# Altium schematic symbol library SCHLIB.SchLib: 2608 symbols (part 3 of 20) (continued)
## CON-PCI Express x8 (continued)

## CON-POWER
designator J?, comment POWER
CONN QC TAB 0.187 SOLDER; Manufacturer: Molex; Manufacturer Part Number: 0197084013; Body Plating: Tin; Body Material: Brass; Gender: Male; Insulation: Non-Insulated; Tab Width: 0.187inch; Tab Thickness: 0.032inch; Tab Length: 0.255inch; Washability: OK; Supplier 1: Digi-Key; Stock 1: 25761; Pricing 1: 1=0.13, 10=0.122, 25=0.0908, 50=0.0778, 100=0.0753, 250=0.06492, 500=0.0623, 1000=0.05452, 2500=0.04932 (USD); Mount: Through Hole; Contact Material: Brass; Contact Plating: Tin; Packaging: Tape and Reel; Package Quantity: 10000; Termination: Standard; Length: 0.51inch; Depth: 6.3mm; ComponentLink1URL: http://www.molex.com/webdocs/datasheets/pdf/en-us/0197084013_QUICK_DISCONNECTS.pdf?src-supplier=Avnet; ComponentLink1Description: http://www.molex.com/webdocs/datasheets/pdf/en-us/0197084013_QUICK_DISCONNECTS.pdf?src-supplier=Avnet; ComponentLink2URL: http://www.molex.com/pdm_docs/sd/197084001_sd.pdf?src-supplier=Digi-Key; ComponentLink2Description: http://www.molex.com/pdm_docs/sd/197084001_sd.pdf?src-supplier=Digi-Key; ComponentLink3URL: http://components.arrow.com/part/dataview/4716213S8383569N3303?src-supplier=Arrow; ComponentLink3Description: http://components.arrow.com/part/dataview/4716213S8383569N3303?src-supplier=Arrow; Supplier Part Number 1: WM14275CT-ND; Supplier 2: Digi-Key; Supplier Part Number 2: 952-3573-ND
footprint CON-POWER
pins: 1 GND_IN, 2, 3

## CON-PREC008DAAN-RC
designator J?, comment 2.54MM
Conn Header Vert 16POS 2.54MM; Manufacturer: Sullins; Manufacturer Part Number: PREC008DAAN-RC; Number of Positions: 16; Connector Type: Male Pin; Pitch: 0.1inch; Supplier 1: Digi-Key; Supplier Part Number 1: S2012EC-08-ND; RoHS: Yes; Category: Connectors; Stock 1: 1761; Pricing 1: 1=0.35000, 10=0.33300, 25=0.28600, 50=0.24300, 100=0.23340, 250=0.20960, 500=0.20008 (USD); Mount: Through Hole; Color: Black; Contact Plating: Tin; Package Quantity: 1; Number of Rows: 2; Packaging: Bulk; Termination: Solder; Series: -; Contact Type: Male Pin; Row Spacing: 0.1inch; Contact Mating Length: 0.23inch; RoHS Compliant: Yes; ComponentLink1URL: https://datasheet.ciiva.com/740/xrxczzzdxxn-rc-11636-b-740877.pdf?src-supplier=Digi-Key; ComponentLink1Description: https://datasheet.ciiva.com/740/xrxczzzdxxn-rc-11636-b-740877.pdf?src-supplier=Digi-Key
pins: 1, 2, 3, 4, 5, 6, 7, 8, 9, 10, 11, 12, 13, 14, 15, 16

## CON-PT02Y10-6P-SCC-023
designator J?, comment PT02Y10-6P-SCC
PT 6C 6#20 PIN RECP; Manufacturer 1: Amphenol Socapex; Manufacturer Part Number 1: PT02Y10-6P-SCC-023; Body Material: Aluminium; Gender: Receptacle; Number of Contacts: 6; Connector Type: Circular; Washability: OK; Supplier 1: Farnell; Stock 1: 0; Pricing 1: 1=33,95000, 5=30,00000, 10=25,80000, 25=22,24000 (EUR); RoHS: Yes; Contact Material: Copper Alloy; Contact Plating: Gold; Termination: Solder; REACH SVHC: Yes; Supplier Part Number 1: 2270273
footprint CON-PT02Y10-6P
pins: A, B, C, D, E, F

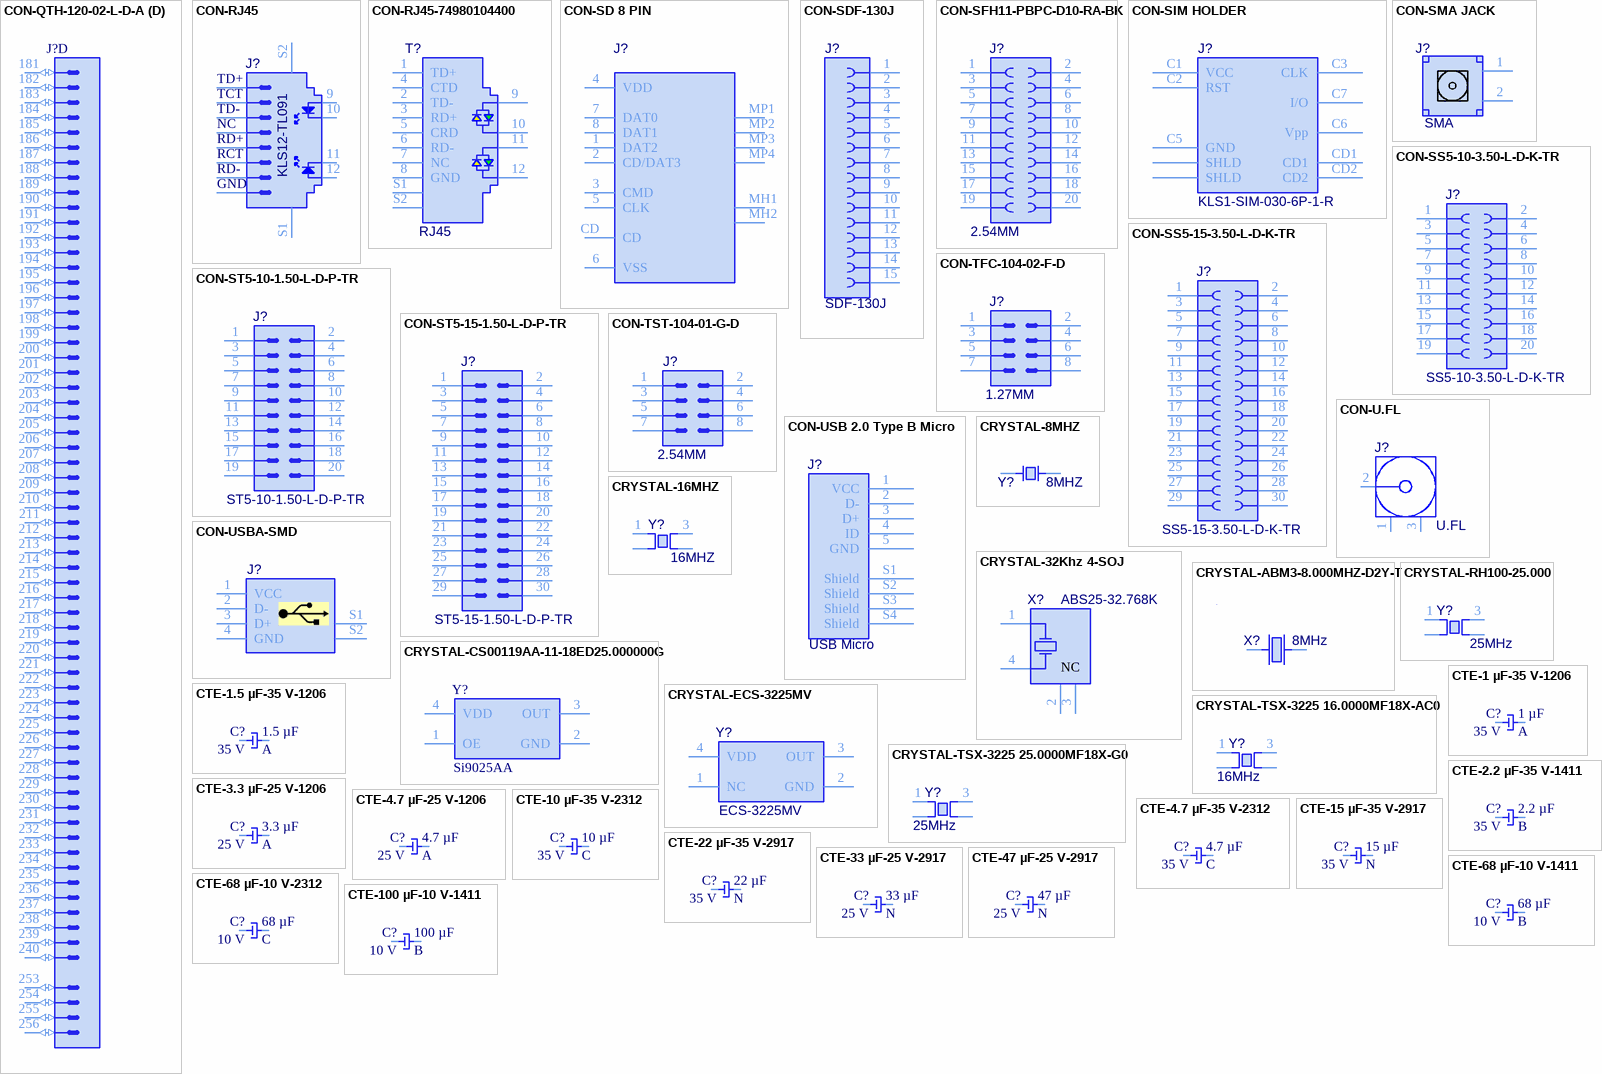
[diagram p10: symbols CON-QTH-120-02-L-D-A to CTE-100 µF-10 V-1411]

## CON-QTH-120-02-L-D-A
designator J?
CONN HDR 240POS SMD GOLD; Part Description: 240 Contacts ((2X30)x4), Pitch 0.5mm, Straight Double Row High Speed Ground Plane Header (Lead Style 7.26mm); Manufacturer: SAMTEC; Manufacturer Part Number: QTH-120-02-L-D-A; PressFit: No; Component Kind: Standard; Component Type: Standard; Footprint: SAMTEC_QTH-120-02-L-D-A; Pin Count: 256; Mounted: Yes; Socket: No; Sense: No; SMD: Yes; Status: None; ComponentHeight: 7.26mm
footprint SAMTEC_QTH-120-02-L-D-A
part A pins: 1 (io), 2 (io), 3 (io), 4 (io), 5 (io), 6 (io), 7 (io), 8 (io), 9 (io), 10 (io), 11 (io), 12 (io), 13 (io), 14 (io), 15 (io), 16 (io), 17 (io), 18 (io), 19 (io), 20 (io), 21 (io), 22 (io), 23 (io), 24 (io), 25 (io), 26 (io), 27 (io), 28 (io), 29 (io), 30 (io), 31 (io), 32 (io), 33 (io), 34 (io), 35 (io), 36 (io), 37 (io), 38 (io), 39 (io), 40 (io), 41 (io), 42 (io), 43 (io), 44 (io), 45 (io), 46 (io), 47 (io), 48 (io), 49 (io), 50 (io), 51 (io), 52 (io), 53 (io), 54 (io), 55 (io), 56 (io), 57 (io), 58 (io), 59 (io), 60 (io), 241 (io), 242 (io), 243 (io), 244 (io)
part B pins: 61 (io), 62 (io), 63 (io), 64 (io), 65 (io), 66 (io), 67 (io), 68 (io), 69 (io), 70 (io), 71 (io), 72 (io), 73 (io), 74 (io), 75 (io), 76 (io), 77 (io), 78 (io), 79 (io), 80 (io), 81 (io), 82 (io), 83 (io), 84 (io), 85 (io), 86 (io), 87 (io), 88 (io), 89 (io), 90 (io), 91 (io), 92 (io), 93 (io), 94 (io), 95 (io), 96 (io), 97 (io), 98 (io), 99 (io), 100 (io), 101 (io), 102 (io), 103 (io), 104 (io), 105 (io), 106 (io), 107 (io), 108 (io), 109 (io), 110 (io), 111 (io), 112 (io), 113 (io), 114 (io), 115 (io), 116 (io), 117 (io), 118 (io), 119 (io), 120 (io), 245 (io), 246 (io), 247 (io), 248 (io)
part C pins: 121 (io), 122 (io), 123 (io), 124 (io), 125 (io), 126 (io), 127 (io), 128 (io), 129 (io), 130 (io), 131 (io), 132 (io), 133 (io), 134 (io), 135 (io), 136 (io), 137 (io), 138 (io), 139 (io), 140 (io), 141 (io), 142 (io), 143 (io), 144 (io), 145 (io), 146 (io), 147 (io), 148 (io), 149 (io), 150 (io), 151 (io), 152 (io), 153 (io), 154 (io), 155 (io), 156 (io), 157 (io), 158 (io), 159 (io), 160 (io), 161 (io), 162 (io), 163 (io), 164 (io), 165 (io), 166 (io), 167 (io), 168 (io), 169 (io), 170 (io), 171 (io), 172 (io), 173 (io), 174 (io), 175 (io), 176 (io), 177 (io), 178 (io), 179 (io), 180 (io), 249 (io), 250 (io), 251 (io), 252 (io)
part D pins: 181 (io), 182 (io), 183 (io), 184 (io), 185 (io), 186 (io), 187 (io), 188 (io), 189 (io), 190 (io), 191 (io), 192 (io), 193 (io), 194 (io), 195 (io), 196 (io), 197 (io), 198 (io), 199 (io), 200 (io), 201 (io), 202 (io), 203 (io), 204 (io), 205 (io), 206 (io), 207 (io), 208 (io), 209 (io), 210 (io), 211 (io), 212 (io), 213 (io), 214 (io), 215 (io), 216 (io), 217 (io), 218 (io), 219 (io), 220 (io), 221 (io), 222 (io), 223 (io), 224 (io), 225 (io), 226 (io), 227 (io), 228 (io), 229 (io), 230 (io), 231 (io), 232 (io), 233 (io), 234 (io), 235 (io), 236 (io), 237 (io), 238 (io), 239 (io), 240 (io), 253 (io), 254 (io), 255 (io), 256 (io)

## CON-RJ45
designator J?, comment KLS12-TL091
CONN MAGJACK 1PORT 100 BASE-TX; Manufacturer: Pulse; Manufacturer Part Number: KLS12-TL091-1X1-G/Y-03; Connector Type: RJ45; Number of Ports: 1; Number of Contacts: 8; Gender: Female; Shielding: Shielded; Direction: Down; Number of Cores per Jack: 4; Pitch: 2.54mm; Washability: OK; Supplier 1: Digi-Key; Supplier Part Number 1: 553-1345-ND; Stock 1: 67; Pricing 1: 1=6.260000, 10=6.003000, 25=5.481200, 50=5.220000, 100=4.959000, 250=4.437000, 500=4.176000, 1000=3.654000, 2500=3.471300 (USD); RoHS: Yes; Mount: Through Hole; Color: Green,Yellow; Contact Plating: Gold; Contact Material: Bronze; Housing Material: Thermoplastic; Min Operating Temperature: 0°C; Max Operating Temperature: 70°C; Package Quantity: 25; Orientation: Right Angle; Packaging: Bulk; Termination: Solder; Number of Rows: 1; Number of Positions Loaded: 8; Length: 16.26mm; Depth: 21.59mm; Radiation Hardening: No; Lead Free: Lead Free; ComponentLink1URL: https://datasheet.ciiva.com/3138/+j414-3138717.pdf?src-supplier=Avnet; ComponentLink1Description: https://datasheet.ciiva.com/3138/+j414-3138717.pdf?src-supplier=Avnet; ComponentLink2URL: https://datasheet.ciiva.com/25908/+j414-25908734.pdf?src-supplier=Avnet+Europe; ComponentLink2Description: https://datasheet.ciiva.com/25908/+j414-25908734.pdf?src-supplier=Avnet+Europe
footprint CON-RJ45-KLS12-TL091 (MagJack, 14-Leads, Body 21.59x16.13mm)
pins: 1 TD+, 2 TD-, 3 RD+, 4 TCT, 5 RCT, 6 RD-, 7 NC, 8 GND, 9, 10, 11, 12, S1, S2

## CON-RJ45-74980104400
designator T?, comment RJ45
CONN JACK 1PORT 100 BASE-T PCB; Manufacturer: Wurth Electronics; Manufacturer Part Number: 74980104400; ComponentLink1Description: Manufacturer; ComponentLink1URL: http://www.we-online.de; ComponentLink2Description: Datasheet; ComponentLink2URL: https://www.we-online.com/catalog/datasheet/74980104400.pdf; Supplier 1: Digi-Key; Supplier Part Number 1: 732-13939-1-ND; Stock: 86; Pricing: 1=5.82, 5=5.2, 10=4.78, 50=4.26 (USD); RoHS: No
footprint CON-RJ45-74980104400 (10/100Base-T, THT, 1x1, Tab up, w/o shield tabs, LED L-R yellow-green/yellow-green, THR)
pins: 1 TD+, 2 TD-, 3 RD+, 4 CTD, 5 CRD, 6 RD-, 7 NC, 8 GND, 9, 10, 11, 12, S1 Shield, S2 Shield

## CON-SD 8 PIN
designator J?, comment CONNECTOR MICRO SD CARD SMD KLS  (value not drawn)
112J-TDAR-R01-KLS1-TF-003; Manufacturer: Attend; Washability: OK; Supplier 1: TME; Manufacturer Part Number: 112J-TDAR-R01; Stock 1: 5522; Pricing 1: 1=1,23000, 10=1,08000, 50=0,98000, 200=0,88000, 1000=0,74000 (USD); RoHS: No; Supplier Part Number 1: MCC-SDMICRO/3
footprint CON-SD CARD 8 PIN
pins: 1 DAT2, 2 CD/DAT3, 3 CMD, 4 VDD, 5 CLK, 6 VSS, 7 DAT0, 8 DAT1, CD, MH1, MH2, MP1, MP2, MP3, MP4

## CON-SDF-130J
designator J?, comment SDF-130J
CONN RCPT FMALE DIN 13POS SOLDER; Manufacturer: CUI; Current Rating: 2A; Connector Type: Jack; Number of Positions: 13; Shielding: Shielded; Washability: OK; Supplier 1: Mouser; Manufacturer Part Number: SDF-130J; Stock 1: 733; Pricing 1: 1=4.5, 10=4.32, 50=3.78, 100=3.6, 1000=2.61, 10000=2.61 (USD); Mount: Through Hole; Contact Plating: Silver; Contact Material: Brass; Insulation Material: Plastic; Min Operating Temperature: -40°C; Max Operating Temperature: 85°C; Fastening Type: Pull,Push; Packaging: Bulk; Termination: Solder; Orientation: Horizontal; Number of Contacts: 13; Features: Shielded; Lead Free: Lead Free; Supplier Part Number 1: 490-SDF-130J
footprint CON-SDF130J
pins: 1, 2, 3, 4, 5, 6, 7, 8, 9, 10, 11, 12, 13, 14, 15

## CON-SFH11-PBPC-D10-RA-BK
designator J?, comment 2.54MM
CONN HDR 20POS 0.1 GOLD PCB R/A; Manufacturer 1: Sullins; Manufacturer Part Number: SFH11-PBPC-D10-RA-BK; Number of Positions: 20; Connector Type: Header,Socket; Pitch: 0.1inch; Supplier 1: Digi-Key; Stock 1: 6200; Pricing 1: 1=1,40000, 10=1,26800, 100=1,08680, 500=0,90562, 1000=0,77625, 5000=0,74750 (USD); RoHS: Yes; Mount: Through Hole; Color: Black; Contact Plating: Gold; Package Quantity: 1; Number of Rows: 2; Packaging: Tray; Termination: Solder; Row Spacing: 0.1inch; Lead Free: Lead Free; ComponentLink1URL: https://datasheet.ciiva.com/16226/sfh11-pbpc-d10-ra-bk-16226946.pdf?src-supplier=Future+Electronics; ComponentLink1Description: https://datasheet.ciiva.com/16226/sfh11-pbpc-d10-ra-bk-16226946.pdf?src-supplier=Future+Electronics; ComponentLink2URL: https://datasheet.ciiva.com/754/sfh11-pxxc-dxx-ra-xx11161-c-754566.pdf?src-supplier=Digi-Key; ComponentLink2Description: https://datasheet.ciiva.com/754/sfh11-pxxc-dxx-ra-xx11161-c-754566.pdf?src-supplier=Digi-Key; Supplier Part Number 1: S9205-ND
footprint CON-FP-SFH11-PBPC-D10-RA-BK-MFG
pins: 1, 2, 3, 4, 5, 6, 7, 8, 9, 10, 11, 12, 13, 14, 15, 16, 17, 18, 19, 20

## CON-SIM HOLDER
designator J?, comment KLS1-SIM-030-6P-1-R
CONN SIM CARD PUSH-PUSH R/A SMD; Manufacturer 1: Molex; Manufacturer Part Number 1: 47553-0001; Max Voltage Rating (DC): 50V; Connector Type: Socket; Number of Contacts: 6; Current Rating: 500mA; Gender: Female; Pitch: 1.27mm; Washability: OK; Supplier 1: Digi-Key; Supplier Part Number 1: WM3293CT-ND; RoHS: Yes; Category: Memory Connectors; Stock 1: 1272; Pricing 1: 1=3.54000, 10=3.39600, 25=3.11280, 50=2.97120, 100=2.82960, 250=2.47592 (USD); Mount: Surface Mount; Contact Material: Bronze,Copper Alloy,Copper; Contact Plating: Gold; Housing Material: Nylon; Min Operating Temperature: -20°C; Max Operating Temperature: 85°C; Number of Rows: 2; Orientation: Right Angle; Packaging: Tape and Reel; Package Quantity: 1200; Termination: SMD/SMT; Number of Circuits: 6; Voltage Rating (DC): 50V; Length: 20.95mm; Depth: 26.5mm; Width: 19.35mm; Radiation Hardening: No; Lead Free: Lead Free; REACH SVHC: Unknown; ComponentLink1URL: https://datasheet.ciiva.com/1104/ps-47553-201-1104611.pdf?src-supplier=Element14; ComponentLink1Description: https://datasheet.ciiva.com/1104/ps-47553-201-1104611.pdf?src-supplier=Element14; ComponentLink2URL: https://datasheet.ciiva.com/30230/0475530001-memory-card-socket-30230845.pdf?src-supplier=Onlinecomponents.com; ComponentLink2Description: https://datasheet.ciiva.com/30230/0475530001-memory-card-socket-30230845.pdf?src-supplier=Onlinecomponents.com; ComponentLink3URL: https://datasheet.ciiva.com/46391/1912411-46391052.pdf?src-supplier=Element14; ComponentLink3Description: https://datasheet.ciiva.com/46391/1912411-46391052.pdf?src-supplier=Element14; ComponentLink4URL: https://datasheet.ciiva.com/9464/0475530001-memory-card-socket-9464895.pdf?src-supplier=Avnet; ComponentLink4Description: https://datasheet.ciiva.com/9464/0475530001-memory-card-socket-9464895.pdf?src-supplier=Avnet
footprint CON-SIM (MOLEX:0475530001,KLS:693013050811)
pins: C1 VCC, C2 RST, C3 CLK, C5 GND, C6 Vpp, C7 I/O, CD1, CD2, MP1 SHLD, MP2 SHLD

## CON-SMA JACK
designator J?, comment SMA
CONN SMA JACK STR 50 OHM PCB; Manufacturer: TE Connectivity; Manufacturer Part Number: 5-1814832-1; Body Material: Zinc; Plating: Nickel; Body Plating: Gold; Dielectric Material: PTFE; Impedance: 50R; Frequency: 3GHz; Gender: Female; Connector Type: Jack,SMA; Polarity: Normal; Wire/Cable Type: Coaxial; Insulation Resistance: 5GR; Connector System: Cable-to-Board; Number of Positions: 1; Sealable: No (Without); Tail Length: 4mm; Washability: OK; Supplier 1: Digi-Key; Stock 1: 45089; Pricing 1: 1=1.99, 10=1.804, 25=1.6936, 50=1.62, 100=1.5464, 250=1.39908, 500=1.28864, 1000=1.10454 (USD); Mount: PCB,Through Hole; Case/Package: SMA; Contact Material: Bronze; Contact Plating: Gold; Insulation Material: Polytetrafluoroethylene; Min Operating Temperature: -67°C; Max Operating Temperature: 185°C; Termination: Through Hole; Orientation: Straight; Package Quantity: 1; Fastening Type: Threaded; Packaging: Box; Max Frequency: 3GHz; Length: 0.532inch; Depth: 6.4mm; Radiation Hardening: No; REACH SVHC: No SVHC; Lead Free: Lead Free; ELV: Compliant; ComponentLink1URL: https://www.te.com/commerce/DocumentDelivery/DDEController?Action=srchrtrv&DocNm=1814832&DocType=Customer+Drawing&DocLang=English&src-supplier=Digi-Key; ComponentLink1Description: https://www.te.com/commerce/DocumentDelivery/DDEController?Action=srchrtrv&DocNm=1814832&DocType=Customer+Drawing&DocLang=English&src-supplier=Digi-Key; ComponentLink2URL: http://www.te.com/commerce/DocumentDelivery/DDEController?Action=showdoc&DocId=Customer+Drawing%7F1814832%7FA%7Fpdf%7FEnglish%7FENG_CD_1814832_A.pdf&src-supplier=Avnet; ComponentLink2Description: http://www.te.com/commerce/DocumentDelivery/DDEController?Action=showdoc&DocId=Customer+Drawing%7F1814832%7FA%7Fpdf%7FEnglish%7FENG_CD_1814832_A.pdf&src-supplier=Avnet; ComponentLink3URL: https://www.verical.com/server-webapp/html/getDatasheet?partID=396696&src-supplier=Verical; ComponentLink3Description: https://www.verical.com/server-webapp/html/getDatasheet?partID=396696&src-supplier=Verical; ComponentLink4URL: http://www.onlinecomponents.com/productFiles/mf-AMP/eng_cd_1814832_a.pdf?src-supplier=Onlinecomponents.com; ComponentLink4Description: http://www.onlinecomponents.com/productFiles/mf-AMP/eng_cd_1814832_a.pdf?src-supplier=Onlinecomponents.com; ComponentLink5URL: http://www.te.com/commerce/DocumentDelivery/DDEController?Action=showdoc&DocId=Customer+Drawing%7F1814832%7FA%7Fpdf%7FEnglish%7FENG_CD_1814832_A.pdf&src-supplier=Avnet+Europe; ComponentLink5Description: http://www.te.com/commerce/DocumentDelivery/DDEController?Action=showdoc&DocId=Customer+Drawing%7F1814832%7FA%7Fpdf%7FEnglish%7FENG_CD_1814832_A.pdf&src-supplier=Avnet+Europe; ComponentLink6URL: http://www.te.com/commerce/DocumentDelivery/DDEController?Action=showdoc&DocId=Customer+Drawing%7F1814832%7FA%7Fpdf%7FEnglish%7FENG_CD_1814832_A.pdf&src-supplier=Avnet+Asia; ComponentLink6Description: http://www.te.com/commerce/DocumentDelivery/DDEController?Action=showdoc&DocId=Customer+Drawing%7F1814832%7FA%7Fpdf%7FEnglish%7FENG_CD_1814832_A.pdf&src-supplier=Avnet+Asia; ComponentLink7URL: http://www.farnell.com/datasheets/1803168.pdf?src-supplier=Newark; ComponentLink7Description: http://www.farnell.com/datasheets/1803168.pdf?src-supplier=Newark; ComponentLink8URL: http://www1.futureelectronics.com/doc/TE%20CONNECTIVITY/5-1814832-1.pdf?src-supplier=Future+Electronics; ComponentLink8Description: http://www1.futureelectronics.com/doc/TE%20CONNECTIVITY/5-1814832-1.pdf?src-supplier=Future+Electronics; Supplier Part Number 1: A97594-ND
footprint CON-SMA
pins: 1, 2

## CON-SS5-10-3.50-L-D-K-TR
designator J?, comment SS5-10-3.50-L-D-K-TR
0.50 mm Razor Beam™ LP Slim Socket Strip; Manufacturer: Samtec; Number of Positions: 20; Mated Stacking Heights: 6mm; Supplier 1: Digi-Key; Manufacturer Part Number: SS5-10-3.50-L-D-K-TR; RoHS: No; Category: Board to Board Connectors; Stock 1: 359; Pricing 1: 1=3.48000, 10=3.33600, 100=2.78000, 500=2.36300 (USD); Mount: Surface Mount; Contact Plating: Gold; Connector Type: Socket; Packaging: Cut Tape; Number of Rows: 2; RoHS Compliant: No; ComponentLink1URL: http://suddendocs.samtec.com/catalog_english/st5.pdf?src-supplier=Digi-Key; ComponentLink1Description: http://suddendocs.samtec.com/catalog_english/st5.pdf?src-supplier=Digi-Key; Supplier Part Number 1: SAM14576CT-ND
footprint CON-SS5-10-3.50-L-D-K-TR (0.50 mm pitch)
pins: 1, 2, 3, 4, 5, 6, 7, 8, 9, 10, 11, 12, 13, 14, 15, 16, 17, 18, 19, 20

## CON-SS5-15-3.50-L-D-K-TR
designator J?, comment SS5-15-3.50-L-D-K-TR
0.50 MM RAZOR BEAM LP SLIM SOCK; Manufacturer: Samtec; Supplier 1: Digi-Key; Supplier Part Number 1: 612-SS5-15-3.50-L-D-K-CT-ND; Manufacturer Part Number: SS5-15-3.50-L-D-K-TR; RoHS: No; Category: Connectors; Stock 1: 35; Pricing 1: 1=4.08000, 10=3.91200, 100=3.26000, 500=2.77100 (USD); RoHS Compliant: No
footprint CON-SS5-15-3.50-X-D-K-XX
pins: 1, 2, 3, 4, 5, 6, 7, 8, 9, 10, 11, 12, 13, 14, 15, 16, 17, 18, 19, 20, 21, 22, 23, 24, 25, 26, 27, 28, 29, 30

## CON-ST5-10-1.50-L-D-P-TR
designator J?, comment ST5-10-1.50-L-D-P-TR
CONN HDR 20POS SMD GOLD; Manufacturer: Samtec; Resistance: 180R; Tolerance: 1%; Max Power Dissipation: 250mW; Temperature Coefficient: 100ppm/°C; Number of Positions: 20; Mated Stacking Heights: 5mm; Manufacturer Part Number: ST5-10-1.50-L-D-P-TR; RoHS: Yes; Category: Connectors; Pricing 1: 1075=2.05538, 2150=1.98450, 3225=1.91362 (USD); Mount: Surface Mount; Case/Package: 1206; Contact Plating: Gold; Min Operating Temperature: -55°C; Max Operating Temperature: 155°C; Resistor Type: Thick Film; Features: Moisture Resistant,Automotive AEC-Q200; Packaging: Tape and Reel; Number of Terminations: 2; Number of Rows: 2; RoHS Compliant: Yes; ComponentLink1URL: http://suddendocs.samtec.com/prints/st5-xx-x.xx-x-d-p-tr-footprint.pdf?src-supplier=Digi-Key; ComponentLink1Description: http://suddendocs.samtec.com/prints/st5-xx-x.xx-x-d-p-tr-footprint.pdf?src-supplier=Digi-Key; ComponentLink2URL: http://suddendocs.samtec.com/prints/st5-xx-x.xx-x-d-p-tr-mkt.pdf?src-supplier=Digi-Key; ComponentLink2Description: http://suddendocs.samtec.com/prints/st5-xx-x.xx-x-d-p-tr-mkt.pdf?src-supplier=Digi-Key; Stock 2: 731; Pricing 2: 1=4.62000, 10=4.43000, 50=4.43000, 100=3.70000, 1000=2.68000, 10000=2.46000 (USD); Supplier 1: Digi-Key; Supplier Part Number 1: SAM14640TR-ND
footprint CON-ST5-10-1.50-L-D-P-TR
pins: 1, 2, 3, 4, 5, 6, 7, 8, 9, 10, 11, 12, 13, 14, 15, 16, 17, 18, 19, 20

## CON-ST5-15-1.50-L-D-P-TR
designator J?, comment ST5-15-1.50-L-D-P-TR
CONN HDR 30POS SMD GOLD; Manufacturer: Samtec; Supplier 1: Digi-Key; Supplier Part Number 1: SAM16030CT-ND; Manufacturer Part Number: ST5-15-1.50-L-D-P-TR; RoHS: Yes; Category: Connectors; Stock 1: 261; Pricing 1: 1=4.13000, 10=3.96000, 25=3.63000, 50=3.46500, 100=3.30000, 250=2.88752, 500=2.80500 (USD); RoHS Compliant: Yes
footprint CON-ST5-15-1.00-L-D-P-TR
pins: 1, 2, 3, 4, 5, 6, 7, 8, 9, 10, 11, 12, 13, 14, 15, 16, 17, 18, 19, 20, 21, 22, 23, 24, 25, 26, 27, 28, 29, 30

## CON-TFC-104-02-F-D
designator J?, comment 1.27MM
.050 X .050 TERMINAL STRIP; Manufacturer: Samtec; MP: TFC-104-02-F-D; MF: Samtec Inc.; Package: None; Availability: Unavailable; Price: None; Manufacturer Part Number: TFC-104-02-F-D; RoHS: No; Category: Connectors; Supplier 1: Mouser; Supplier Part Number 1: 200-TFC10402FD; Stock: 158; Pricing: 1=1.42, 10=1.24, 25=1.16, 100=1.13, 250=1.04, 500=0.879 (USD)
footprint CON-TFC-104-02-F-D
pins: 1, 2, 3, 4, 5, 6, 7, 8

## CON-TST-104-01-G-D
designator J?, comment 2.54MM
Connector Header Through Hole 8 position 0.100 (2.54mm); MP: TST-104-01-G-D; MF: Samtec; Number of Contacts: 8; Gender: Male; Availability: Bad; Price: None; Package: None; SnapEDA_Link: https://www.snapeda.com/parts/TST-104-01-G-D/Samtec/view-part/3256031/?ref=snap; Value: *; BuyPart: https://www.snapeda.com/parts/TST-104-01-G-D/Samtec/view-part/3256031/?ref=eda; Supplier 1: Mouser; Manufacturer 1: Samtec; Manufacturer Part Number: TST-104-01-G-D; Stock 1: 382; Pricing 1: 1=2,02000, 10=1,76000, 25=1,64000, 100=1,62000, 250=1,49000, 500=1,25000, 1000=1,13000, 1=2,38000, 10=2,08000, 25=1,94000, 100=1,91000, 250=1,76000, 500=1,48000 (EUR); RoHS: Yes; Mount: Through Hole; Contact Plating: Gold; Termination: Solder; Number of Rows: 2; Packaging: Bulk; Pitch: 2.54mm; Radiation Hardening: No; ComponentLink1URL: https://datasheet.ciiva.com/10161/htst-10161119.pdf?src-supplier=Avnet; ComponentLink1Description: https://datasheet.ciiva.com/10161/htst-10161119.pdf?src-supplier=Avnet; Supplier Part Number 1: 200-TST10401GD
footprint CON-TST-104-01-G-D
pins: 1, 2, 3, 4, 5, 6, 7, 8

## CON-U.FL
designator J?, comment U.FL
CONN UMCC JACK STR 50OHM SMD; Manufacturer: TE Connectivity AMP; Manufacturer Part Number: 1909763-1; Body Material: Polymer,Liquid Crystal Polymer; Body Plating: Gold; Dielectric Material: Polymer; Connector System: Cable-to-Board; Number of Positions: 1; Frequency: 6GHz; Sealable: No (Without); Gender: Female; Impedance: 50R; Washability: OK; Supplier 1: Digi-Key; Supplier Part Number 1: A118077CT-ND; Stock 1: 93118; Pricing 1: 1=0.50000, 10=0.47200, 100=0.36150, 500=0.31436, 1000=0.25935 (USD); RoHS: Yes; Mount: Panel; Case/Package: SMD/SMT; Contact Plating: Gold; Contact Material: Copper Alloy; Housing Color: Beige; Insulation Material: Thermoplastic; Min Operating Temperature: -40°C; Max Operating Temperature: 194°C; Max Frequency: 6GHz; Termination: SMD/SMT; Packaging: Tape and Reel; Package Quantity: 1; Fastening Type: Push,Pull; Orientation: Straight; Connector Type: Jack; Length: 3mm; Radiation Hardening: No; ELV: Compliant; Lead Free: Lead Free; ComponentLink1URL: https://datasheet.ciiva.com/16312/eng-cd-1909763-b-16312469.pdf?src-supplier=Future+Electronics; ComponentLink1Description: https://datasheet.ciiva.com/16312/eng-cd-1909763-b-16312469.pdf?src-supplier=Future+Electronics; ComponentLink2URL: https://datasheet.ciiva.com/16469/eng-cd-1909763-b-16469221.pdf?src-supplier=Avnet+Asia; ComponentLink2Description: https://datasheet.ciiva.com/16469/eng-cd-1909763-b-16469221.pdf?src-supplier=Avnet+Asia; ComponentLink3URL: https://datasheet.ciiva.com/9423/eng-cd-1909763-b-9423785.pdf?src-supplier=Avnet; ComponentLink3Description: https://datasheet.ciiva.com/9423/eng-cd-1909763-b-9423785.pdf?src-supplier=Avnet; ComponentLink4URL: https://datasheet.ciiva.com/29191/eng-cd-1909763-b1-basefilename-29191146.pdf?src-supplier=Digi-Key; ComponentLink4Description: https://datasheet.ciiva.com/29191/eng-cd-1909763-b1-basefilename-29191146.pdf?src-supplier=Digi-Key; ComponentLink5URL: https://datasheet.ciiva.com/29191/eng-cd-1909763-b1-basefilename-29191148.pdf?src-supplier=Digi-Key; ComponentLink5Description: https://datasheet.ciiva.com/29191/eng-cd-1909763-b1-basefilename-29191148.pdf?src-supplier=Digi-Key
footprint TECO-1909763-1_V (SMD, 3-Leads, Body 2.6x2.6mm, Height 1.25mm)
pins: 1, 2, 3

## CON-USB 2.0 Type B Micro
designator J?, comment USB Micro
CONN RCPT USB2.0 MICRO B SMD R/A; Manufacturer Part Number: 5UR2B01MF-105G0BUHR1; Washability: OK
footprint CON-Micro USB 2.0 (Micro USB 2.0 SMT Type B Horizontal 5 Contacts)
pins: 1 VCC, 2 D-, 3 D+, 4 ID, 5 GND, S1 Shield, S2 Shield, S3 Shield, S4 Shield

## CON-USBA-SMD
designator J?  (value not drawn)
CONN USB A TYPE ULTRA FLAT SMD; Manufacturer: CNC Tech; Manufacturer Part Number: 1001-011-01101; Number of Contacts: 4; Gender: Male; Washability: OK; Supplier 1: Digi-Key; Stock 1: 34588; Pricing 1: 1=0.77, 10=0.72, 25=0.648, 50=0.576, 100=0.552, 250=0.504, 500=0.48, 1000=0.396, 2500=0.36 (USD); Mount: Horizontal,Surface Mount; Package Quantity: 100; Packaging: Bulk; Connector Type: USB; ComponentLink1URL: http://cnctech.us/pdfs/1001-011-01101.pdf; ComponentLink1Description: http://cnctech.us/pdfs/1001-011-01101.pdf; Supplier Part Number 1: 1175-1008-ND
pins: 1 VCC (power), 2 D-, 3 D+, 4 GND (power), S1, S2

## CRYSTAL-8MHZ
designator Y?, comment 8MHZ
CRYSTAL 8.0000MHZ 20PF SMD; Manufacturer: CTS; Manufacturer Part Number: ATS08ASM-1E; Frequency Tolerance: 30ppm; ESR (Equivalent Series Resistance): 60R; Frequency Stability: 50ppm; Washability: OK; Supplier 1: Digi-Key; Stock 1: 18000; Pricing 1: 1000=0.1952, 3000=0.183, 5000=0.1769, 10000=0.1708 (USD); Mount: Surface Mount; Case/Package: Metal; Number of Pins: 2; Contact Plating: Copper,Silver,Tin; Min Operating Temperature: -40°C; Max Operating Temperature: 85°C; Load Capacitance: 20pF; Frequency: 8MHz; Packaging: Tape and Reel; Package Quantity: 1000; Tolerance: 30ppm; Termination: SMD/SMT; Series Resistance: 60R; Length: 0.437inch; Height: 0.169inch; Width: 3.8mm; Lead Free: Lead Free; ComponentLink1URL: http://www.ctscorp.com/wp-content/uploads/2015/11/008-0309-0.pdf; ComponentLink1Description: http://www.ctscorp.com/wp-content/uploads/2015/11/008-0309-0.pdf; ComponentLink2URL: http://www.mouser.com/ds/2/96/008-0309-0-32667.pdf; ComponentLink2Description: http://www.mouser.com/ds/2/96/008-0309-0-32667.pdf; ComponentLink3URL: http://www.ctscorp.com/wp-content/uploads/ATS-ATSSM.pdf; ComponentLink3Description: http://www.ctscorp.com/wp-content/uploads/ATS-ATSSM.pdf; ComponentLink4URL: https://www.ctscorp.com/wp-content/uploads/ATS-ATSSM.pdf; ComponentLink4Description: https://www.ctscorp.com/wp-content/uploads/ATS-ATSSM.pdf; Supplier Part Number 1: CTX1055TR-ND
footprint CRYSTAL1
pins: 1, 2

## CRYSTAL-16MHZ
designator Y?, comment 16MHZ
CRYSTAL 16MHZ 12PF SMD; Manufacturer: Raltron Electronics; Manufacturer Part Number: RH100-16.000-12-3050-EX; Washability: OK; Supplier 1: Digi-Key; Supplier Part Number 1: 2151-RH100-16.000-12-1010-EXT-TRCT-ND; Stock 1: 3000; Pricing 1: 1=0.68000, 10=0.59800, 50=0.55900, 100=0.49400, 500=0.46800, 1000=0.39000 (USD); ComponentLink1URL: http://datasheet.octopart.com/RH100-16.000-12-1010-EXT-TR-Raltron-Electronics-datasheet-137142244.pdf?src-supplier=Raltron+Electronics; ComponentLink1Description: http://datasheet.octopart.com/RH100-16.000-12-1010-EXT-TR-Raltron-Electronics-datasheet-137142244.pdf?src-supplier=Raltron+Electronics
footprint CRYSTAL-3.2X2.5
pins: 1, 2, 3, 4

## CRYSTAL-32Khz 4-SOJ
designator X?, comment ABS25-32.768K
CRYSTAL 32.7680KHZ 12.5PF SMD; Manufacturer: Abracon; Manufacturer Part Number: ABS25-32.768KHZ-T; Frequency: 32.768kHz; Frequency Tolerance: 20ppm; ESR (Equivalent Series Resistance): 50kR; Washability: OK; Supplier 1: Digi-Key; Stock 1: 461783; Pricing 1: 1=0.63000, 10=0.52300, 50=0.47020, 100=0.41800, 500=0.39710, 1000=0.33440 (USD); RoHS: Yes; Mount: Surface Mount; Case/Package: SMD/SMT; Number of Pins: 4; Min Operating Temperature: -40°C; Max Operating Temperature: 85°C; Load Capacitance: 12.5pF; Packaging: Tape and Reel; Package Quantity: 1000; Tolerance: 20ppm; Termination: SMD/SMT; Series Resistance: 50kR; Length: 8mm; Height: 0.098inch; Width: 0.15inch; Depth: 3.8mm; Radiation Hardening: No; Lead Free: Lead Free; REACH SVHC: No SVHC; ComponentLink1URL: https://datasheet.ciiva.com/7998/1700987-7998663.pdf?src-supplier=Element14; ComponentLink1Description: https://datasheet.ciiva.com/7998/1700987-7998663.pdf?src-supplier=Element14; ComponentLink2URL: https://datasheet.ciiva.com/854/abs25-854195.pdf?src-supplier=Digi-Key; ComponentLink2Description: https://datasheet.ciiva.com/854/abs25-854195.pdf?src-supplier=Digi-Key; ComponentLink3URL: https://datasheet.ciiva.com/854/abs25-854197.pdf?src-supplier=Digi-Key; ComponentLink3Description: https://datasheet.ciiva.com/854/abs25-854197.pdf?src-supplier=Digi-Key; ComponentLink4URL: https://datasheet.ciiva.com/16336/abs25-16336119.pdf?src-supplier=Future+Electronics; ComponentLink4Description: https://datasheet.ciiva.com/16336/abs25-16336119.pdf?src-supplier=Future+Electronics; ComponentLink5URL: https://datasheet.ciiva.com/26812/getdatasheetpartid-719721-26812171.pdf?src-supplier=Verical; ComponentLink5Description: https://datasheet.ciiva.com/26812/getdatasheetpartid-719721-26812171.pdf?src-supplier=Verical; ComponentLink6URL: https://datasheet.ciiva.com/854/abs25-854196.pdf?src-supplier=Digi-Key; ComponentLink6Description: https://datasheet.ciiva.com/854/abs25-854196.pdf?src-supplier=Digi-Key; ComponentLink7URL: https://datasheet.ciiva.com/28508/1856019-28508682.pdf?src-supplier=Element14; ComponentLink7Description: https://datasheet.ciiva.com/28508/1856019-28508682.pdf?src-supplier=Element14; Supplier Part Number 1: 535-9166-1-ND
footprint ABRA-ABS25-4_V (SMD, 4-Leads, Body 8x3.8mm, Pitch 5.5mm, Height 2.5mm)
pins: 1 X1, 2 NC, 3 NC, 4 X2

## CRYSTAL-ABM3-8.000MHZ-D2Y-T
designator X?, comment Frequency: 8MHz  (hidden comment: CRY-ABM3-8.000MHZ)
CRYSTAL 8.0000MHZ 18PF SMD; Manufacturer: Abracon; Manufacturer Part Number: ABM3-8.000MHZ-D2Y-T; ESR (Equivalent Series Resistance): 500R; Frequency Tolerance: 20ppm; Frequency Stability: 30ppm; Washability: OK; Supplier 1: Digi-Key; Stock 1: 89429; Pricing 1: 1=1,14000, 10=1,01200, 50=0,94600, 100=0,83600, 500=0,79200 (USD); RoHS: Yes; Mount: Surface Mount; Case/Package: CSMD; Number of Pins: 2; Min Operating Temperature: -40°C; Max Operating Temperature: 85°C; Load Capacitance: 18pF; Packaging: Tape and Reel; Tolerance: 20ppm; Package Quantity: 1000; Termination: SMD/SMT; Composition: Ceramic; Series Resistance: 500R; Length: 5mm; Height: 0.051inch; Width: 3.2mm; Depth: 3.2mm; Radiation Hardening: No; REACH SVHC: Unknown; Lead Free: Lead Free; ComponentLink1URL: https://datasheet.ciiva.com/4945/abm3-47699-4945424.pdf?src-supplier=Mouser; ComponentLink1Description: https://datasheet.ciiva.com/4945/abm3-47699-4945424.pdf?src-supplier=Mouser; ComponentLink2URL: https://datasheet.ciiva.com/862/abm3-862465.pdf?src-supplier=Digi-Key; ComponentLink2Description: https://datasheet.ciiva.com/862/abm3-862465.pdf?src-supplier=Digi-Key; ComponentLink3URL: https://datasheet.ciiva.com/862/abm3-862466.pdf?src-supplier=Digi-Key; ComponentLink3Description: https://datasheet.ciiva.com/862/abm3-862466.pdf?src-supplier=Digi-Key; ComponentLink4URL: https://datasheet.ciiva.com/862/abm3-862467.pdf?src-supplier=Digi-Key; ComponentLink4Description: https://datasheet.ciiva.com/862/abm3-862467.pdf?src-supplier=Digi-Key; ComponentLink5URL: https://datasheet.ciiva.com/1357/1754353-1357270.pdf?src-supplier=Element14; ComponentLink5Description: https://datasheet.ciiva.com/1357/1754353-1357270.pdf?src-supplier=Element14; ComponentLink6URL: https://datasheet.ciiva.com/3174/abm3-3174137.pdf?src-supplier=Avnet; ComponentLink6Description: https://datasheet.ciiva.com/3174/abm3-3174137.pdf?src-supplier=Avnet; ComponentLink7URL: https://datasheet.ciiva.com/26812/getdatasheetpartid-723821-26812186.pdf?src-supplier=Verical; ComponentLink7Description: https://datasheet.ciiva.com/26812/getdatasheetpartid-723821-26812186.pdf?src-supplier=Verical; ComponentLink8URL: https://datasheet.ciiva.com/5788/abm3-5788043.pdf?src-supplier=Farnell; ComponentLink8Description: https://datasheet.ciiva.com/5788/abm3-5788043.pdf?src-supplier=Farnell; ComponentLink9URL: https://datasheet.ciiva.com/16392/abm3-16392475.pdf?src-supplier=Future+Electronics; ComponentLink9Description: https://datasheet.ciiva.com/16392/abm3-16392475.pdf?src-supplier=Future+Electronics; ComponentLink10URL: https://datasheet.ciiva.com/7998/abm3-7998589.pdf?src-supplier=Element14; ComponentLink10Description: https://datasheet.ciiva.com/7998/abm3-7998589.pdf?src-supplier=Element14; Supplier Part Number 1: 535-10630-1-ND
footprint SMD_5.00x 3.20x1.3_2P - duplicate
pins: 1, 2

## CRYSTAL-CS00119AA-11-18ED25.000000G
designator Y?, comment Si9025AA
MEMS OSC XO 25.0000MHZ LVCMOS; Manufacturer: SiTime; Manufacturer Part Number: CS00119AA-11-18ED25.000000G; Supplier 1: Avnet; Supplier Part Number 1: CS00119AA-11-18ED25.000000G; RoHS: No; Stock 1: 230; Pricing 1: 42=8.66492, 50=8.41770, 90=8.17890, 210=7.94010, 420=7.70130, 2100=7.46250, 4200=7.22370 (USD)
footprint CRYSTAL-2.5X2 - Sitime
pins: 1 OE, 2 GND, 3 OUT, 4 VDD

## CRYSTAL-ECS-3225MV
designator Y?, comment ECS-3225MV
XTAL OSC XO 16.0000MHZ HCMOS SMD; Manufacturer: ECS International; Manufacturer Part Number: ECS-3225MV-160-BN-TR; Washability: OK; Supplier 1: Digi-Key; Stock 1: 740; Pricing 1: 1=0.92000, 10=0.81700, 50=0.76380, 100=0.67510, 500=0.63954 (USD); RoHS: No; ComponentLink1URL: https://www.ecsxtal.com/store/pdf/ECS-3225MV.pdf?src-supplier=Digi-Key; ComponentLink1Description: https://www.ecsxtal.com/store/pdf/ECS-3225MV.pdf?src-supplier=Digi-Key; Supplier Part Number 1: XC2875CT-ND
footprint CRYSTAL-3.2X2.5
pins: 1 NC, 2 GND, 3 OUT, 4 VDD

## CRYSTAL-RH100-25.000
designator Y?, comment 25MHz
Xtal 25MHZ 10PF SMD; Manufacturer: Raltron Electronics; Manufacturer Part Number: RH100-25.000-18-F-3030-T; Washability: OK; Supplier 1: Digi-Key; Supplier Part Number 1: 2151-RH100-25.000-10-F-2030-EXT-TRCT-ND; Stock 1: 3000; Pricing 1: 1=0.68000, 10=0.59800, 50=0.55900, 100=0.49400, 500=0.46800, 1000=0.39000 (USD); ComponentLink1URL: http://datasheet.octopart.com/RH100-25.000-10-F-2030-EXT-TR-Raltron-Electronics-datasheet-137142244.pdf?src-supplier=Raltron+Electronics; ComponentLink1Description: http://datasheet.octopart.com/RH100-25.000-10-F-2030-EXT-TR-Raltron-Electronics-datasheet-137142244.pdf?src-supplier=Raltron+Electronics
footprint CRYSTAL-3.2X2.5
pins: 1, 2, 3, 4

## CRYSTAL-TSX-3225 16.0000MF18X-AC0
designator Y?, comment 16MHz
CRYSTAL 16.00 MHZ 9PF SMD; Manufacturer: Epson; Manufacturer Part Number: TSX-3225 16.0000MF18X-AC0; ESR (Equivalent Series Resistance): 60R; Frequency Stability: 18ppm; Frequency Tolerance: 10ppm; Supplier 1: Digi-Key; Supplier Part Number 1: SER4070CT-ND; Stock: 467; Pricing: 1=0.33, 10=0.275, 50=0.2476, 100=0.22, 500=0.209 (USD); RoHS: Yes; Mount: Surface Mount; Case/Package: SMD/SMT; Min Operating Temperature: -20°C; Max Operating Temperature: 75°C; Packaging: Tape and Reel; Frequency: 16MHz; Load Capacitance: 9pF; Length: 0.126inch; Width: 0.098inch; Height: 0.024inch; ComponentLink1URL: https://www.eea.epson.com/wp-content/uploads/2016/11/November-2016-PCS-MASTER-BOOK.pdf?src-supplier=Verical; ComponentLink1Description: https://www.eea.epson.com/wp-content/uploads/2016/11/November-2016-PCS-MASTER-BOOK.pdf?src-supplier=Verical; ComponentLink2URL: https://www5.epsondevice.com/en/information/support/pdf/june_2018_psc_masterbook.pdf?src-supplier=Digi-Key; ComponentLink2Description: https://www5.epsondevice.com/en/information/support/pdf/june_2018_psc_masterbook.pdf?src-supplier=Digi-Key; ComponentLink3URL: https://www.eea.epson.com/wp-content/uploads/2016/11/November-2016-PCS-MASTER-BOOK.pdf?src-supplier=Mouser; ComponentLink3Description: https://www.eea.epson.com/wp-content/uploads/2016/11/November-2016-PCS-MASTER-BOOK.pdf?src-supplier=Mouser; ComponentLink4URL: https://www.eea.epson.com/wp-content/uploads/2016/11/November-2016-PCS-MASTER-BOOK.pdf?src-supplier=Dove; ComponentLink4Description: https://www.eea.epson.com/wp-content/uploads/2016/11/November-2016-PCS-MASTER-BOOK.pdf?src-supplier=Dove
footprint CRY-TSX-3225
pins: 1, 2, 3, 4

## CRYSTAL-TSX-3225 25.0000MF18X-G0
designator Y?, comment 25MHz
Crystal 25MHz ±10ppm (Tol) ±18ppm (Stability) 20pF FUND 40Ohm 4-Pin Mini-CSMD T/R; Manufacturer: Epson; Manufacturer Part Number: TSX-3225 25.0000MF18X-G0; ESR (Equivalent Series Resistance): 40R; Supplier 1: Digi-Key; Supplier Part Number 1: SER4375CT-ND; RoHS: Yes; Category: Crystals; Pricing 1: 1=0.33000, 10=0.27500, 50=0.24760, 100=0.22000, 500=0.20900 (USD); Mount: Surface Mount; Case/Package: SMD/SMT; Min Operating Temperature: -40°C; Max Operating Temperature: 85°C; Packaging: Tape and Reel; Frequency: 25MHz; Load Capacitance: 20pF; Frequency Stability: 18ppm; Frequency Tolerance: 10ppm; Length: 0.126inch; Width: 0.098inch; Height: 0.024inch; RoHS Compliant: Yes; ComponentLink1URL: https://support.epson.biz/td/api/doc_check.php?dl=brief_FA-238V_en.pdf&src-supplier=Digi-Key; ComponentLink1Description: https://support.epson.biz/td/api/doc_check.php?dl=brief_FA-238V_en.pdf&src-supplier=Digi-Key; ComponentLink2URL: https://www5.epsondevice.com/en/information/support/pdf/june_2018_psc_masterbook.pdf?src-supplier=Digi-Key; ComponentLink2Description: https://www5.epsondevice.com/en/information/support/pdf/june_2018_psc_masterbook.pdf?src-supplier=Digi-Key; ComponentLink3URL: https://support.epson.biz/td/api/doc_check.php?dl=brief_TSX-3225&amp;lang=en&src-supplier=Digi-Key; ComponentLink3Description: https://support.epson.biz/td/api/doc_check.php?dl=brief_TSX-3225&amp;lang=en&src-supplier=Digi-Key
footprint CRY-TSX-3225
pins: 1, 2, 3, 4

## CTE-1 µF-35 V-1206
designator C?, comment Voltage - Rated: 35 V  Manufacturer Size Code: A  (hidden comment: 1 µF)
CAP TANT 1UF 10% 35V 1206; Manufacturer Part Number: F931V105KAA; Manufacturer: KYOCERA AVX; Type: Molded; ESR: 7.5Ohm @ 100kHz; Lifetime @ Temp#: 2000 Hrs @ 125°C; Object  Type: Part; Design Item ID: CTE-1 µF-35 V-1206; Series: F93; Tolerance: ±10%; Operating Temperature: -55°C ~ 125°C; Mounting Type: Surface Mount; Package: 1206; Size: 3.20mm x 1.60mm; Height: 1.80mm; Features: General Purpose; Failure Rate: -; Category: Capacitor; Value: 1 µF
footprint CAPMP3216X180N
pins: 1, 2

## CTE-1.5 µF-35 V-1206
designator C?, comment Voltage - Rated: 35 V  Manufacturer Size Code: A  (hidden comment: 1.5 µF)
CAP TANT 1.5UF 10% 35V 1206; Manufacturer Part Number: F931V155KAA; Manufacturer: KYOCERA AVX; Type: Molded; ESR: 7.5Ohm @ 100kHz; Lifetime @ Temp#: 2000 Hrs @ 125°C; Object  Type: Part; Design Item ID: CTE-1.5 µF-35 V-1206; Series: F93; Tolerance: ±10%; Operating Temperature: -55°C ~ 125°C; Mounting Type: Surface Mount; Package: 1206; Size: 3.20mm x 1.60mm; Height: 1.80mm; Features: General Purpose; Failure Rate: -; Category: Capacitor; Value: 1.5 µF
footprint CAPMP3216X180N
pins: 1, 2

## CTE-2.2 µF-35 V-1411
designator C?, comment Voltage - Rated: 35 V  Manufacturer Size Code: B  (hidden comment: 2.2 µF)
CAP TANT 2.2UF 10% 35V 1411; Manufacturer Part Number: F931V225KBA; Manufacturer: KYOCERA AVX; Type: Molded; ESR: 3.8Ohm @ 100kHz; Lifetime @ Temp#: 2000 Hrs @ 125°C; Object  Type: Part; Design Item ID: CTE-2.2 µF-35 V-1411; Series: F93; Tolerance: ±10%; Operating Temperature: -55°C ~ 125°C; Mounting Type: Surface Mount; Package: 1411; Size: 3.50mm x 2.80mm; Height: 2.30mm; Features: General Purpose; Failure Rate: -; Category: Capacitor; Value: 2.2 µF
footprint CAPMP3528X210N
pins: 1, 2

## CTE-3.3 µF-25 V-1206
designator C?, comment Voltage - Rated: 25 V  Manufacturer Size Code: A  (hidden comment: 3.3 µF)
CAP TANT 3.3UF 10% 25V 1206; Manufacturer Part Number: F931E335KAA; Manufacturer: KYOCERA AVX; Type: Molded; ESR: 6Ohm @ 100kHz; Lifetime @ Temp#: 2000 Hrs @ 125°C; Object  Type: Part; Design Item ID: CTE-3.3 µF-25 V-1206; Series: F93; Tolerance: ±10%; Operating Temperature: -55°C ~ 125°C; Mounting Type: Surface Mount; Package: 1206; Size: 3.20mm x 1.60mm; Height: 1.80mm; Features: General Purpose; Failure Rate: -; Category: Capacitor; Value: 3.3 µF
footprint CAPMP3216X180N
pins: 1, 2

## CTE-4.7 µF-25 V-1206
designator C?, comment Voltage - Rated: 25 V  Manufacturer Size Code: A  (hidden comment: 4.7 µF)
CAP TANT 4.7UF 10% 25V 1206; Manufacturer Part Number: F931E475KAA; Manufacturer: KYOCERA AVX; Type: Molded; ESR: 4Ohm @ 100kHz; Lifetime @ Temp#: 2000 Hrs @ 125°C; Object  Type: Part; Design Item ID: CTE-4.7 µF-25 V-1206; Series: F93; Value: 4.7 µF; Tolerance: ±10%; Operating Temperature: -55°C ~ 125°C; Mounting Type: Surface Mount; Package: 1206; Size: 3.20mm x 1.60mm; Height: 1.80mm; Features: General Purpose; Failure Rate: -; Category: Capacitor
footprint CAPMP3216X180N
pins: 1, 2

## CTE-4.7 µF-35 V-2312
designator C?, comment Voltage - Rated: 35 V  Manufacturer Size Code: C  (hidden comment: 4.7 µF)
CAP TANT 4.7UF 10% 35V 2312; Manufacturer Part Number: F931V475KCC; Manufacturer: KYOCERA AVX; Type: Molded; ESR: 1.8Ohm @ 100kHz; Lifetime @ Temp#: 2000 Hrs @ 125°C; Object  Type: Part; Design Item ID: CTE-4.7 µF-35 V-2312; Series: F93; Tolerance: ±10%; Operating Temperature: -55°C ~ 125°C; Mounting Type: Surface Mount; Package: 2312; Size: 6.00mm x 3.20mm; Height: 2.80mm; Features: General Purpose; Failure Rate: -; Category: Capacitor; Value: 4.7 µF
footprint CAPMP6032X280N
pins: 1, 2

## CTE-10 µF-35 V-2312
designator C?, comment Voltage - Rated: 35 V  Manufacturer Size Code: C  (hidden comment: 10 µF)
CAP TANT 10UF 10% 35V 2312; Manufacturer Part Number: F931V106KCC; Manufacturer: KYOCERA AVX; Type: Molded; ESR: 1.6Ohm @ 100kHz; Lifetime @ Temp#: 2000 Hrs @ 125°C; Object  Type: Part; Design Item ID: CTE-10 µF-35 V-2312; Series: F93; Tolerance: ±10%; Operating Temperature: -55°C ~ 125°C; Mounting Type: Surface Mount; Package: 2312; Size: 6.00mm x 3.20mm; Height: 2.80mm; Features: General Purpose; Failure Rate: -; Category: Capacitor; Value: 10 µF
footprint CAPMP6032X280N
pins: 1, 2

## CTE-15 µF-35 V-2917
designator C?, comment Voltage - Rated: 35 V  Manufacturer Size Code: N  (hidden comment: 15 µF)
CAP TANT 15UF 10% 35V 2917; Manufacturer Part Number: F931V156KNC; Manufacturer: KYOCERA AVX; Type: Molded; ESR: 700mOhm @ 100kHz; Lifetime @ Temp#: 2000 Hrs @ 125°C; Object  Type: Part; Design Item ID: CTE-15 µF-35 V-2917; Series: F93; Value: 15 µF; Tolerance: ±10%; Operating Temperature: -55°C ~ 125°C; Mounting Type: Surface Mount; Package: 2917; Size: 7.30mm x 4.30mm; Height: 3.00mm; Features: General Purpose; Failure Rate: -; Category: Capacitor
footprint CAPMP7343X310N
pins: 1, 2

## CTE-22 µF-35 V-2917
designator C?, comment Voltage - Rated: 35 V  Manufacturer Size Code: N  (hidden comment: 22 µF)
CAP TANT 22UF 10% 35V 2917; Manufacturer Part Number: F931V226KNC; Manufacturer: KYOCERA AVX; Type: Molded; ESR: 700mOhm @ 100kHz; Lifetime @ Temp#: 2000 Hrs @ 125°C; Object  Type: Part; Design Item ID: CTE-22 µF-35 V-2917; Series: F93; Tolerance: ±10%; Operating Temperature: -55°C ~ 125°C; Mounting Type: Surface Mount; Package: 2917; Size: 7.30mm x 4.30mm; Height: 3.00mm; Features: General Purpose; Failure Rate: -; Category: Capacitor; Value: 22 µF
footprint CAPMP7343X310N
pins: 1, 2

## CTE-33 µF-25 V-2917
designator C?, comment Voltage - Rated: 25 V  Manufacturer Size Code: N  (hidden comment: 33 µF)